# Altium footprint library IntLib.PcbLib: 221 footprints (part 8 of 14)
Each footprint in its own frame and in the unit in brackets; x right, y up, seen from the top. Pads: shape width x height; smd on the part's side, far side on the other; paste and mask are expansions set on the pad; w line width, h text height; cw(c..) or ccw(c..) is an arc to the next point about the centre after c.
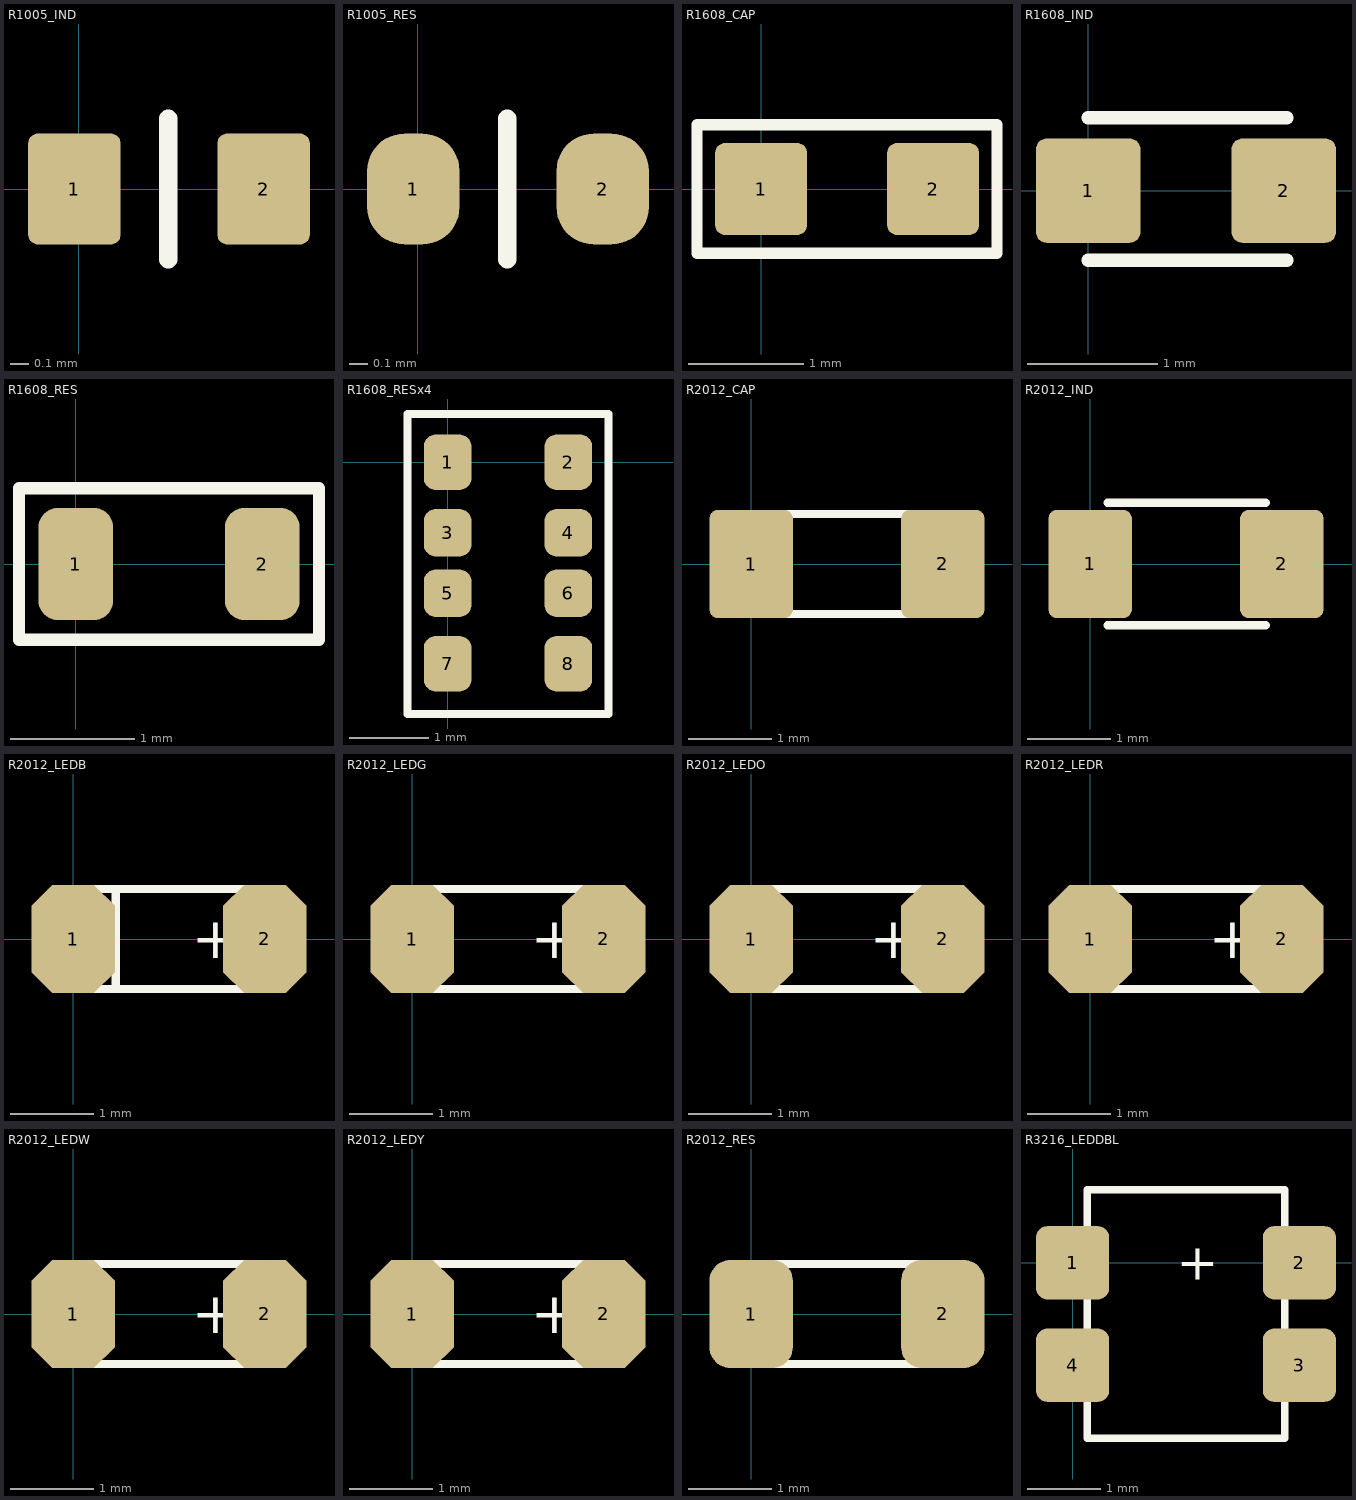
[diagram p7: the footprints below, top view; thin cyan lines are the x and y axes]

## R1005_IND [mm] "SMD IND-0402"
pads (2):
  rrect20% 0.5x0.6 smd: 1(-0.025,0) 2(1,0)
Top Overlay:
  lines w0.1: 0.483,-0.381 0.483,0.381
3D body: height 0.25, standoff 0, extent -0.017,-0.254 0.983,0.246

## R1005_RES [mm] "SMD RES-0402"
pads (2):
  rrect80% 0.5x0.6 smd: 1(-0.025,0) 2(1,0)
Top Overlay:
  lines w0.1: 0.483,-0.381 0.483,0.381
3D body: height 0.41, standoff 0, extent -0.067,-0.279 1.083,0.271

## R1608_CAP [mm] "SMD CAP-0603"
height 0.87
pads (2):
  rrect20% 0.8x0.8 smd: 1(0,0) 2(1.5,0)
Top Overlay:
  lines w0.1: -0.559,-0.559 -0.559,0.559 2.057,0.559 2.057,-0.559 -0.559,-0.559
3D body: height 0.3, standoff 0, extent -0.05,-0.4 1.55,0.4

## R1608_IND [mm] "SMD IND-0603"
height 0.87
pads (2):
  rrect20% 0.8x0.8 smd: 1(0,0) 2(1.5,0)
Top Overlay:
  lines w0.1: 0,-0.533 1.524,-0.533 ; 0,0.559 1.524,0.559
3D body: height 0.8, standoff 0, extent -0.051,-0.406 1.549,0.394

## R1608_RES [mm] "SMD RES-0603"
height 0.508
pads (2):
  rrect50% 0.6x0.9 smd: 1(0,0) 2(1.5,0)
Top Overlay:
  lines w0.1: -0.457,-0.61 -0.457,0.61 1.956,0.61 1.956,-0.61 -0.457,-0.61
3D body: height 0.56, standoff 0, extent -0.113,-0.381 1.587,0.419

## R1608_RESx4 [mm] "SMD RES-0603"
height 0.508
pads (8):
  rrect50% 0.6x0.7 smd: 1(0,0) 2(1.524,0) 7(0,-2.54) 8(1.524,-2.54)
  rrect50% 0.6x0.6 smd: 3(0,-0.889) 4(1.524,-0.889) 5(0,-1.651) 6(1.524,-1.651)
Top Overlay:
  lines w0.1: -0.508,-3.175 2.032,-3.175 2.032,0.61 -0.508,0.61 -0.508,-3.175
3D body: height 0.5, standoff 0, extent 0.051,-2.87 1.651,0.33

## R2012_CAP [mm] "SMD CAP-0805"
pads (2):
  rrect20% 1x1.3 smd: 1(0,0) 2(2.3,0)
Top Overlay:
  lines w0.1: 0.2,-0.6 2.1,-0.6 2.1,0 2.1,0.6 0.2,0.6 0.2,0 0.2,-0.6
3D body: height 0.57, standoff 0, extent 0.152,-0.635 2.152,0.635

## R2012_IND [mm] "SMD IND-0805"
pads (2):
  rrect20% 1x1.3 smd: 1(0,0) 2(2.3,0)
Top Overlay:
  lines w0.1: 0.208,-0.737 2.108,-0.737 ; 0.208,0.737 2.108,0.737
3D body: height 0.95, standoff 0, extent 0.108,-0.584 2.108,0.616

## R2012_LEDB [mm]
pads (2):
  oct 1x1.3 smd: 1(0,0) 2(2.3,0)
Top Overlay:
  lines w0.1: 0.51,-0.598 0.51,0.6 ; 0.2,-0.6 2.1,-0.6 2.1,0 2.1,0.6 0.2,0.6 0.2,0 0.2,-0.6
  text "+" at 1.422,-0.229 h0.5
3D body: height 1.1, standoff 0, extent 0.152,-0.635 2.172,0.615

## R2012_LEDG [mm]
pads (2):
  oct 1x1.3 smd: 1(0,0) 2(2.3,0)
Top Overlay:
  lines w0.1: 0.2,-0.6 2.1,-0.6 2.1,0 2.1,0.6 0.2,0.6 0.2,0 0.2,-0.6
  text "+" at 1.422,-0.229 h0.5
3D body: height 1.1, standoff 0, extent 0.178,-0.61 2.198,0.64

## R2012_LEDO [mm]
pads (2):
  oct 1x1.3 smd: 1(0,0) 2(2.3,0)
Top Overlay:
  lines w0.1: 0.2,-0.6 2.1,-0.6 2.1,0 2.1,0.6 0.2,0.6 0.2,0 0.2,-0.6
  text "+" at 1.422,-0.229 h0.5
3D body: height 1.1, standoff 0, extent 0.229,-0.625 2.249,0.625

## R2012_LEDR [mm]
pads (2):
  oct 1x1.3 smd: 1(0,0) 2(2.3,0)
Top Overlay:
  lines w0.1: 0.2,-0.6 0.2,0 0.2,0.6 2.1,0.6 2.1,0 2.1,-0.6 0.2,-0.6
  text "+" at 1.422,-0.229 h0.5
3D body: height 1.1, standoff 0, extent 0.133,-0.635 2.153,0.615

## R2012_LEDW [mm]
pads (2):
  oct 1x1.3 smd: 1(0,0) 2(2.3,0)
Top Overlay:
  lines w0.1: 0.2,-0.6 2.1,-0.6 2.1,0 2.1,0.6 0.2,0.6 0.2,0 0.2,-0.6
  text "+" at 1.422,-0.229 h0.5
3D body: height 0.85, standoff 0.01, extent 0.127,-0.449 2.19,0.457

## R2012_LEDY [mm]
pads (2):
  oct 1x1.3 smd: 1(0,0) 2(2.3,0)
Top Overlay:
  lines w0.1: 0.2,-0.6 0.2,0 0.2,0.6 2.1,0.6 2.1,0 2.1,-0.6 0.2,-0.6
  text "+" at 1.422,-0.229 h0.5
3D body: height 1.1, standoff 0, extent 0.133,-0.635 2.153,0.615

## R2012_RES [mm] "SMD RES-0805"
pads (2):
  rrect50% 1x1.3 smd: 1(0,0) 2(2.3,0)
Top Overlay:
  lines w0.1: 0.2,-0.6 2.1,-0.6 2.1,0 2.1,0.6 0.2,0.6 0.2,0 0.2,-0.6
3D body: height 0.45, standoff 0, extent 0.152,-0.635 2.152,0.615

## R3216_LEDDBL [mm] "1206"
pads (4):
  rrect30% 1x1 smd: 1(0,0) 2(3.1,0) 3(3.1,-1.4) 4(0,-1.4)
Top Overlay:
  lines w0.1: 0.2,-2.4 0.2,0 0.2,1 2.9,1 2.9,-2.4 0.2,-2.4
  text "+" at 1.422,-0.229 h0.5
3D body: height 1.1, standoff 0, extent -0.1,-2.2 3.1,-0.6
3D body: height 1.1, standoff 0, extent -0.1,-0.8 3.1,0.8